# Altium footprint library Connectors THD.PcbLib: 631 footprints (part 33 of 46)
Each footprint in its own frame and in the unit in brackets; x right, y up, seen from the top. Pads: shape width x height; smd on the part's side, far side on the other; paste and mask are expansions set on the pad; w line width, h text height; cw(c..) or ccw(c..) is an arc to the next point about the centre after c.
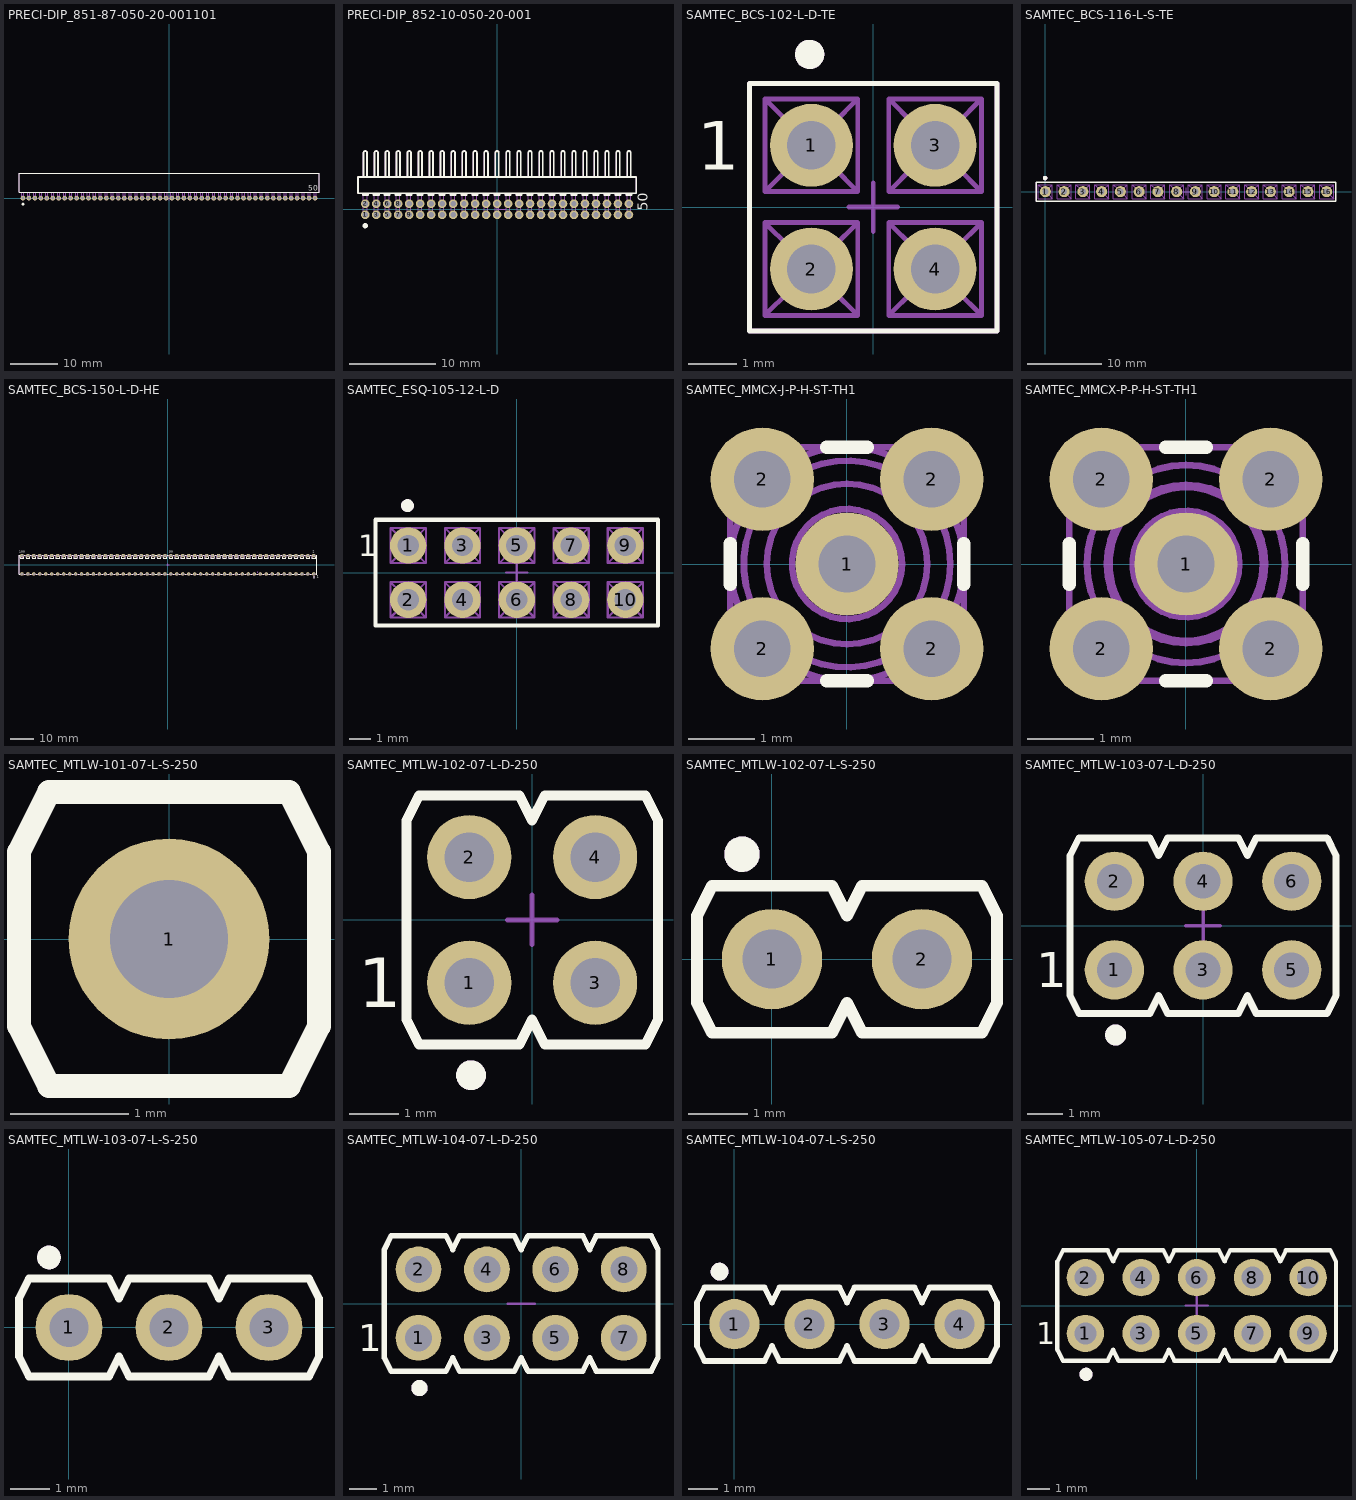
[diagram p32: the footprints below, top view; thin cyan lines are the x and y axes]

## PRECI-DIP_851-87-050-20-001101 [mm] "Pitch 1.27mm, Single Row, Right Angle, 50 Contacts PCB Socket"
height 2.2
pads (50):
  round 1 hole 0.6: 1(-31.115,0) 2(-29.845,0) 3(-28.575,0) 4(-27.305,0) 5(-26.035,0) 6(-24.765,0) 7(-23.495,0) 8(-22.225,0) 9(-20.955,0) 10(-19.685,0) 11(-18.415,0) 12(-17.145,0) 13(-15.875,0) 14(-14.605,0) 15(-13.335,0) 16(-12.065,0) 17(-10.795,0) 18(-9.525,0) 19(-8.255,0) 20(-6.985,0) 21(-5.715,0) 22(-4.445,0) 23(-3.175,0) 24(-1.905,0) 25(-0.635,0) 26(0.635,0) 27(1.905,0) 28(3.175,0) 29(4.445,0) 30(5.715,0) 31(6.985,0) 32(8.255,0) 33(9.525,0) 34(10.795,0) 35(12.065,0) 36(13.335,0) 37(14.605,0) 38(15.875,0) 39(17.145,0) 40(18.415,0) 41(19.685,0) 42(20.955,0) 43(22.225,0) 44(23.495,0) 45(24.765,0) 46(26.035,0) 47(27.305,0) 48(28.575,0) 49(29.845,0) 50(31.115,0)
Top Overlay:
  circle w0.3: c-31.115,-1.27 r0.15
  lines w0.2: -31.955,1.2 -31.955,5.3 31.955,5.3 31.955,1.2 -31.955,1.2
  text "50" at 29.7,1.6 h1.2
Mechanical 8:
  drawing of 202 lines, arcs and shapes, not listed
Mechanical 14:
  drawing of 154 lines, arcs and shapes, not listed
  text "50" at 29.7,1.6 h1.2
3D body: height 2.2, standoff -3.6, extent -31.955,-0.22 31.955,5.3

## PRECI-DIP_852-10-050-20-001 [mm] "50 Contacts, Ultraminiature PCB Pin Connector 1.27mm, Double Row, Solder Tail, Right Angle"
height 3.25
pads (50):
  round 1 hole 0.6: 1(-15.24,-0.635) 2(-15.24,0.635) 3(-13.97,-0.635) 4(-13.97,0.635) 5(-12.7,-0.635) 6(-12.7,0.635) 7(-11.43,-0.635) 8(-11.43,0.635) 9(-10.16,-0.635) 10(-10.16,0.635) 11(-8.89,-0.635) 12(-8.89,0.635) 13(-7.62,-0.635) 14(-7.62,0.635) 15(-6.35,-0.635) 16(-6.35,0.635) 17(-5.08,-0.635) 18(-5.08,0.635) 19(-3.81,-0.635) 20(-3.81,0.635) 21(-2.54,-0.635) 22(-2.54,0.635) 23(-1.27,-0.635) 24(-1.27,0.635) 25(0,-0.635) 26(0,0.635) 27(1.27,-0.635) 28(1.27,0.635) 29(2.54,-0.635) 30(2.54,0.635) 31(3.81,-0.635) 32(3.81,0.635) 33(5.08,-0.635) 34(5.08,0.635) 35(6.35,-0.635) 36(6.35,0.635) 37(7.62,-0.635) 38(7.62,0.635) 39(8.89,-0.635) 40(8.89,0.635) 41(10.16,-0.635) 42(10.16,0.635) 43(11.43,-0.635) 44(11.43,0.635) 45(12.7,-0.635) 46(12.7,0.635) 47(13.97,-0.635) 48(13.97,0.635) 49(15.24,-0.635) 50(15.24,0.635)
Top Overlay:
  drawing of 155 lines, arcs and shapes, not listed
  text "50" at 17.4,-0.2 h1.2
Mechanical 8:
  lines w0.1: 0,1 0,0 1,0
Mechanical 14:
  drawing of 229 lines, arcs and shapes, not listed
3D body: height 3.25, standoff -3.2, extent -16.08,-0.84 16.08,6.735

## SAMTEC_BCS-102-L-D-TE [mm] "4 Contacts - Pitch 2.54mm - Dual Row Horizontal Entry Socket"
height 7.37
pads (4):
  round 1.7 hole 1: 1(-1.27,1.27) 2(-1.27,-1.27) 3(1.27,1.27) 4(1.27,-1.27)
Top Overlay:
  circle w0.3: c-1.305,3.135 r0.15
  lines w0.1: -2.54,-2.54 -2.54,2.54 2.54,2.54 2.54,-2.54 -2.54,-2.54
  text "1" at -3.617,0.772 h1
Mechanical 8:
  lines w0.1: -1.77,-1.27 -1.27,-1.27 ; -1.77,1.27 -1.27,1.27 ; -1.27,-1.77 -1.27,-1.27 ; -1.27,-0.77 -1.27,-1.27 ; -1.27,0.77 -1.27,1.27 ; -1.27,1.77 -1.27,1.27 ; -0.77,-1.27 -1.27,-1.27 ; -0.77,1.27 -1.27,1.27 ; -0.5,0 0,0 ; 0,-0.5 0,0 ; 0,0.5 0,0 ; 0.5,0 0,0 ; 0.77,-1.27 1.27,-1.27 ; 0.77,1.27 1.27,1.27 ; 1.27,-1.77 1.27,-1.27 ; 1.27,0.77 1.27,1.27 ; 1.27,1.77 1.27,1.27 ; 1.77,-1.27 1.27,-1.27 ; 1.77,1.27 1.27,1.27
Mechanical 14:
  circle w0.3: c-1.305,3.135 r0.15
  lines w0.1: -1.71,-0.83 -1.714,-1.714 ; -1.71,1.71 -1.714,0.826 ; 0.83,-0.83 0.826,-1.714 ; 0.83,1.71 0.826,0.826 ; -2.222,-2.222 -1.714,-1.714 ; -2.222,-2.222 -2.222,-0.318 ; -2.222,-2.222 -0.318,-2.222 ; -2.222,-0.318 -1.714,-0.826 -0.826,-0.826 ; -2.222,-0.318 -0.318,-0.318 ; -2.222,0.318 -1.714,0.826 ; -2.222,0.318 -2.222,2.222 ; -2.222,0.318 -0.318,0.318 ; -2.222,2.222 -1.714,1.714 -0.826,1.714 ; -2.222,2.222 -0.318,2.222 ; -1.714,-1.714 -0.826,-1.714 ; -1.714,0.826 -0.826,0.826 ; -0.826,-1.714 -0.318,-2.222 ; -0.826,-1.714 -0.826,-0.826 ; -0.826,-0.826 -0.318,-0.318 ; -0.826,0.826 -0.318,0.318 ; -0.826,0.826 -0.826,1.714 ; -0.826,1.714 -0.318,2.222 ; -0.318,-2.222 -0.318,-0.318 ; -0.318,0.318 -0.318,2.222 ; 0.318,-2.222 0.826,-1.714 ; 0.318,-2.222 0.318,-0.318 ; 0.318,-2.222 2.222,-2.222 ; 0.318,-0.318 0.826,-0.826 1.714,-0.826 ; 0.318,-0.318 2.222,-0.318 ; 0.318,0.318 0.826,0.826 ; 0.318,0.318 0.318,2.222 ; 0.318,0.318 2.222,0.318 ; 0.318,2.222 0.826,1.714 1.714,1.714 ; 0.318,2.222 2.222,2.222 ; 0.826,-1.714 1.714,-1.714 ; 0.826,0.826 1.714,0.826 ; 1.714,-1.714 2.222,-2.222 ; 1.714,-1.714 1.714,-0.826 ; 1.714,-0.826 2.222,-0.318 ; 1.714,0.826 2.222,0.318 ; 1.714,0.826 1.714,1.714 ; 1.714,1.714 2.222,2.222 ; 2.222,-2.222 2.222,-0.318 ; 2.222,0.318 2.222,2.222 ; -2.54,-2.54 -2.54,2.54 2.54,2.54 2.54,-2.54 -2.54,-2.54
  text "1" at -3.617,0.772 h1
3D body: height 7.37, standoff -3.1, extent -2.54,-2.54 2.54,2.54

## SAMTEC_BCS-116-L-S-TE [mm] "16 Contacts - Pitch 2.54mm - Single Row Vertical Entry Socket"
height 7.37
pads (16):
  round 1.5 hole 0.8: 1(0,0) 2(2.54,0) 3(5.08,0) 4(7.62,0) 5(10.16,0) 6(12.7,0) 7(15.24,0) 8(17.78,0) 9(20.32,0) 10(22.86,0) 11(25.4,0) 12(27.94,0) 13(30.48,0) 14(33.02,0) 15(35.56,0) 16(38.1,0)
Top Overlay:
  circle w0.3: c-0.037,1.838 r0.15
  lines w0.2: -1.27,-1.27 -1.27,1.27 39.37,1.27 39.37,-1.27 -1.27,-1.27
Mechanical 8:
  lines w0.1: -0.5,0 0,0 ; 0,-0.5 0,0 ; 0,0.5 0,0 ; 0.5,0 0,0 ; 2.04,0 2.54,0 ; 2.54,-0.5 2.54,0 ; 2.54,0.5 2.54,0 ; 3.04,0 2.54,0 ; 4.58,0 5.08,0 ; 5.08,-0.5 5.08,0 ; 5.08,0.5 5.08,0 ; 5.58,0 5.08,0 ; 7.12,0 7.62,0 ; 7.62,-0.5 7.62,0 ; 7.62,0.5 7.62,0 ; 8.12,0 7.62,0 ; 9.66,0 10.16,0 ; 10.16,-0.5 10.16,0 ; 10.16,0.5 10.16,0 ; 10.66,0 10.16,0 ; 12.2,0 12.7,0 ; 12.7,-0.5 12.7,0 ; 12.7,0.5 12.7,0 ; 13.2,0 12.7,0 ; 14.74,0 15.24,0 ; 15.24,-0.5 15.24,0 ; 15.24,0.5 15.24,0 ; 15.74,0 15.24,0 ; 17.28,0 17.78,0 ; 17.78,-0.5 17.78,0 ; 17.78,0.5 17.78,0 ; 18.28,0 17.78,0 ; 18.55,0 19.05,0 ; 19.05,-0.5 19.05,0 ; 19.05,0.5 19.05,0 ; 19.55,0 19.05,0 ; 19.82,0 20.32,0 ; 20.32,-0.5 20.32,0 ; 20.32,0.5 20.32,0 ; 20.82,0 20.32,0 ; 22.36,0 22.86,0 ; 22.86,-0.5 22.86,0 ; 22.86,0.5 22.86,0 ; 23.36,0 22.86,0 ; 24.9,0 25.4,0 ; 25.4,-0.5 25.4,0 ; 25.4,0.5 25.4,0 ; 25.9,0 25.4,0 ; 27.44,0 27.94,0 ; 27.94,-0.5 27.94,0 ; 27.94,0.5 27.94,0 ; 28.44,0 27.94,0 ; 29.98,0 30.48,0 ; 30.48,-0.5 30.48,0 ; 30.48,0.5 30.48,0 ; 30.98,0 30.48,0 ; 32.52,0 33.02,0 ; 33.02,-0.5 33.02,0 ; 33.02,0.5 33.02,0 ; 33.52,0 33.02,0 ; 35.06,0 35.56,0 ; 35.56,-0.5 35.56,0 ; 35.56,0.5 35.56,0 ; 36.06,0 35.56,0 ; 37.6,0 38.1,0 ; 38.1,-0.5 38.1,0 ; 38.1,0.5 38.1,0 ; 38.6,0 38.1,0
Mechanical 14:
  drawing of 181 lines, arcs and shapes, not listed
3D body: height 7.37, standoff -3.1, extent -1.27,-1.27 39.37,1.27

## SAMTEC_BCS-150-L-D-HE [mm] "100 Contacts - Pitch 2.54mm - Dual Row Horizontal Entry Socket"
height 5.72
pads (100):
  round 1.5 hole 0.8: 1(62.23,-3.935) 2(62.23,3.935) 3(59.69,-3.935) 4(59.69,3.935) 5(57.15,-3.935) 6(57.15,3.935) 7(54.61,-3.935) 8(54.61,3.935) 9(52.07,-3.935) 10(52.07,3.935) 11(49.53,-3.935) 12(49.53,3.935) 13(46.99,-3.935) 14(46.99,3.935) 15(44.45,-3.935) 16(44.45,3.935) 17(41.91,-3.935) 18(41.91,3.935) 19(39.37,-3.935) 20(39.37,3.935) 21(36.83,-3.935) 22(36.83,3.935) 23(34.29,-3.935) 24(34.29,3.935) 25(31.75,-3.935) 26(31.75,3.935) 27(29.21,-3.935) 28(29.21,3.935) 29(26.67,-3.935) 30(26.67,3.935) 31(24.13,-3.935) 32(24.13,3.935) 33(21.59,-3.935) 34(21.59,3.935) 35(19.05,-3.935) 36(19.05,3.935) 37(16.51,-3.935) 38(16.51,3.935) 39(13.97,-3.935) 40(13.97,3.935) 41(11.43,-3.935) 42(11.43,3.935) 43(8.89,-3.935) 44(8.89,3.935) 45(6.35,-3.935) 46(6.35,3.935) 47(3.81,-3.935) 48(3.81,3.935) 49(1.27,-3.935) 50(1.27,3.935) 51(-1.27,-3.935) 52(-1.27,3.935) 53(-3.81,-3.935) 54(-3.81,3.935) 55(-6.35,-3.935) 56(-6.35,3.935) 57(-8.89,-3.935) 58(-8.89,3.935) 59(-11.43,-3.935) 60(-11.43,3.935) 61(-13.97,-3.935) 62(-13.97,3.935) 63(-16.51,-3.935) 64(-16.51,3.935) 65(-19.05,-3.935) 66(-19.05,3.935) 67(-21.59,-3.935) 68(-21.59,3.935) 69(-24.13,-3.935) 70(-24.13,3.935) 71(-26.67,-3.935) 72(-26.67,3.935) 73(-29.21,-3.935) 74(-29.21,3.935) 75(-31.75,-3.935) 76(-31.75,3.935) 77(-34.29,-3.935) 78(-34.29,3.935) 79(-36.83,-3.935) 80(-36.83,3.935) 81(-39.37,-3.935) 82(-39.37,3.935) 83(-41.91,-3.935) 84(-41.91,3.935) 85(-44.45,-3.935) 86(-44.45,3.935) 87(-46.99,-3.935) 88(-46.99,3.935) 89(-49.53,-3.935) 90(-49.53,3.935) 91(-52.07,-3.935) 92(-52.07,3.935) 93(-54.61,-3.935) 94(-54.61,3.935) 95(-57.15,-3.935) 96(-57.15,3.935) 97(-59.69,-3.935) 98(-59.69,3.935) 99(-62.23,-3.935) 100(-62.23,3.935)
Top Overlay:
  drawing of 257 lines, arcs and shapes, not listed
  text "2" at 61.86,5.175 h1
  text "1" at 63.405,-5.546 h1.02
  text "100" at -63.375,5.136 h1
  text "50" at 0.5,5.175 h1
Mechanical 8:
  drawing of 405 lines, arcs and shapes, not listed
Mechanical 14:
  drawing of 308 lines, arcs and shapes, not listed
  text "2" at 61.86,5.175 h1
  text "1" at 63.405,-5.546 h1.02
  text "100" at -63.375,5.136 h1
  text "50" at 0.5,5.175 h1
3D body: height 5.72, standoff -3.1, extent -63.5,-4.064 63.5,4.064

## SAMTEC_ESQ-105-12-L-D [mm] "10 Contacts, Pitch 2.54mm - Top Entry, Dual Row, Through Mount Straigh Socket"
height 11.05
pads (10):
  round 1.7 hole 1: 1(-5.08,1.27) 2(-5.08,-1.27) 3(-2.54,1.27) 4(-2.54,-1.27) 5(0,1.27) 6(0,-1.27) 7(2.54,1.27) 8(2.54,-1.27) 9(5.08,1.27) 10(5.08,-1.27)
Top Overlay:
  circle w0.3: c-5.115,3.135 r0.15
  lines w0.2: -6.604,-2.477 -6.604,2.477 6.604,2.477 6.604,-2.477 -6.604,-2.477
  text "1" at -7.427,0.772 h1
Mechanical 8:
  lines w0.1: -5.58,-1.27 -5.08,-1.27 ; -5.58,1.27 -5.08,1.27 ; -5.08,-1.77 -5.08,-1.27 ; -5.08,-0.77 -5.08,-1.27 ; -5.08,0.77 -5.08,1.27 ; -5.08,1.77 -5.08,1.27 ; -4.58,-1.27 -5.08,-1.27 ; -4.58,1.27 -5.08,1.27 ; -3.04,-1.27 -2.54,-1.27 ; -3.04,1.27 -2.54,1.27 ; -2.54,-1.77 -2.54,-1.27 ; -2.54,-0.77 -2.54,-1.27 ; -2.54,0.77 -2.54,1.27 ; -2.54,1.77 -2.54,1.27 ; -2.04,-1.27 -2.54,-1.27 ; -2.04,1.27 -2.54,1.27 ; -0.5,-1.27 0,-1.27 ; -0.5,0 0,0 ; -0.5,1.27 0,1.27 ; 0,-1.77 0,-1.27 ; 0,-0.77 0,-1.27 ; 0,-0.5 0,0 ; 0,0.5 0,0 ; 0,0.77 0,1.27 ; 0,1.77 0,1.27 ; 0.5,-1.27 0,-1.27 ; 0.5,0 0,0 ; 0.5,1.27 0,1.27 ; 2.04,-1.27 2.54,-1.27 ; 2.04,1.27 2.54,1.27 ; 2.54,-1.77 2.54,-1.27 ; 2.54,-0.77 2.54,-1.27 ; 2.54,0.77 2.54,1.27 ; 2.54,1.77 2.54,1.27 ; 3.04,-1.27 2.54,-1.27 ; 3.04,1.27 2.54,1.27 ; 4.58,-1.27 5.08,-1.27 ; 4.58,1.27 5.08,1.27 ; 5.08,-1.77 5.08,-1.27 ; 5.08,-0.77 5.08,-1.27 ; 5.08,0.77 5.08,1.27 ; 5.08,1.77 5.08,1.27 ; 5.58,-1.27 5.08,-1.27 ; 5.58,1.27 5.08,1.27
Mechanical 14:
  circle w0.3: c-5.115,3.135 r0.15
  lines w0.1: -5.906,-2.095 -5.474,-1.664 ; -5.906,-2.095 -5.906,-0.445 ; -5.906,-2.095 -4.255,-2.095 ; -5.906,-0.445 -5.474,-0.876 ; -5.906,-0.445 -4.255,-0.445 ; -5.906,0.445 -5.474,0.876 ; -5.906,0.445 -5.906,2.095 ; -5.906,0.445 -4.255,0.445 ; -5.906,2.095 -5.474,1.664 ; -5.906,2.095 -4.255,2.095 ; -5.474,-1.664 -5.474,-0.876 ; -5.474,-1.664 -4.686,-1.664 ; -5.474,-0.876 -4.686,-0.876 ; -5.474,0.876 -5.474,1.664 ; -5.474,0.876 -4.686,0.876 ; -5.474,1.664 -4.686,1.664 ; -4.686,-1.664 -4.255,-2.095 ; -4.686,-1.664 -4.686,-0.876 ; -4.686,-0.876 -4.255,-0.445 ; -4.686,0.876 -4.255,0.445 ; -4.686,0.876 -4.686,1.664 ; -4.686,1.664 -4.255,2.095 ; -4.255,-2.095 -4.255,-0.445 ; -4.255,0.445 -4.255,2.095 ; -3.366,-2.095 -2.934,-1.664 ; -3.366,-2.095 -3.366,-0.445 ; -3.366,-2.095 -1.714,-2.095 ; -3.366,-0.445 -2.934,-0.876 ; -3.366,-0.445 -1.714,-0.445 ; -3.366,0.445 -2.934,0.876 ; -3.366,0.445 -3.366,2.095 ; -3.366,0.445 -1.714,0.445 ; -3.366,2.095 -2.934,1.664 ; -3.366,2.095 -1.714,2.095 ; -2.934,-1.664 -2.934,-0.876 ; -2.934,-1.664 -2.146,-1.664 ; -2.934,-0.876 -2.146,-0.876 ; -2.934,0.876 -2.934,1.664 ; -2.934,0.876 -2.146,0.876 ; -2.934,1.664 -2.146,1.664 ; -2.146,-1.664 -1.714,-2.095 ; -2.146,-1.664 -2.146,-0.876 ; -2.146,-0.876 -1.714,-0.445 ; -2.146,0.876 -1.714,0.445 ; -2.146,0.876 -2.146,1.664 ; -2.146,1.664 -1.714,2.095 ; -1.714,-2.095 -1.714,-0.445 ; -1.714,0.445 -1.714,2.095 ; -0.826,-2.095 -0.394,-1.664 ; -0.826,-2.095 -0.826,-0.445 ; -0.826,-2.095 0.826,-2.095 ; -0.826,-0.445 -0.394,-0.876 ; -0.826,-0.445 0.826,-0.445 ; -0.826,0.445 -0.394,0.876 ; -0.826,0.445 -0.826,2.095 ; -0.826,0.445 0.826,0.445 ; -0.826,2.095 -0.394,1.664 ; -0.826,2.095 0.826,2.095 ; -0.394,-1.664 -0.394,-0.876 ; -0.394,-1.664 0.394,-1.664 ; -0.394,-0.876 0.394,-0.876 ; -0.394,0.876 -0.394,1.664 ; -0.394,0.876 0.394,0.876 ; -0.394,1.664 0.394,1.664 ; 0.394,-1.664 0.826,-2.095 ; 0.394,-1.664 0.394,-0.876 ; 0.394,-0.876 0.826,-0.445 ; 0.394,0.876 0.826,0.445 ; 0.394,0.876 0.394,1.664 ; 0.394,1.664 0.826,2.095 ; 0.826,-2.095 0.826,-0.445 ; 0.826,0.445 0.826,2.095 ; 1.714,-2.095 2.146,-1.664 ; 1.714,-2.095 1.714,-0.445 ; 1.714,-2.095 3.366,-2.095 ; 1.714,-0.445 2.146,-0.876 ; 1.714,-0.445 3.366,-0.445 ; 1.714,0.445 2.146,0.876 ; 1.714,0.445 1.714,2.095 ; 1.714,0.445 3.366,0.445 ; 1.714,2.095 2.146,1.664 ; 1.714,2.095 3.366,2.095 ; 2.146,-1.664 2.146,-0.876 ; 2.146,-1.664 2.934,-1.664 ; 2.146,-0.876 2.934,-0.876 ; 2.146,0.876 2.146,1.664 ; 2.146,0.876 2.934,0.876 ; 2.146,1.664 2.934,1.664 ; 2.934,-1.664 3.366,-2.095 ; 2.934,-1.664 2.934,-0.876 ; 2.934,-0.876 3.366,-0.445 ; 2.934,0.876 3.366,0.445 ; 2.934,0.876 2.934,1.664 ; 2.934,1.664 3.366,2.095 ; 3.366,-2.095 3.366,-0.445 ; 3.366,0.445 3.366,2.095 ; 4.255,-2.095 4.686,-1.664 ; 4.255,-2.095 4.255,-0.445 ; 4.255,-2.095 5.906,-2.095 ; 4.255,-0.445 4.686,-0.876 ; 4.255,-0.445 5.906,-0.445 ; 4.255,0.445 4.686,0.876 ; 4.255,0.445 4.255,2.095 ; 4.255,0.445 5.906,0.445 ; 4.255,2.095 4.686,1.664 ; 4.255,2.095 5.906,2.095 ; 4.686,-1.664 4.686,-0.876 ; 4.686,-1.664 5.474,-1.664 ; 4.686,-0.876 5.474,-0.876 ; 4.686,0.876 4.686,1.664 ; 4.686,0.876 5.474,0.876 ; 4.686,1.664 5.474,1.664 ; 5.474,-1.664 5.906,-2.095 ; 5.474,-1.664 5.474,-0.876 ; 5.474,-0.876 5.906,-0.445 ; 5.474,0.876 5.906,0.445 ; 5.474,0.876 5.474,1.664 ; 5.474,1.664 5.906,2.095 ; 5.906,-2.095 5.906,-0.445 ; 5.906,0.445 5.906,2.095 ; -6.604,-2.477 -6.604,2.477 6.604,2.477 6.604,-2.477 -6.604,-2.477
  text "1" at -7.427,0.772 h1
3D body: height 11.05, standoff -2.29, extent -6.604,-2.54 6.604,2.54

## SAMTEC_MMCX-J-P-H-ST-TH1 [mm] "Straight Through-hole 50 Ohm Micro Mini RF Jack, MMCX Serie"
height 4.35
pads (5):
  round 1.55 hole 0.85: 1(0,0) 2(-1.27,-1.27) 2(-1.27,1.27) 2(1.27,-1.27) 2(1.27,1.27)
Top Overlay:
  lines w0.2: -1.75,-0.308 -1.75,0.308 ; -0.308,-1.75 0.308,-1.75 ; -0.308,1.75 0.308,1.75 ; 1.75,-0.308 1.75,0.308
Mechanical 8:
  lines w0.1: -1.77,-1.27 -1.27,-1.27 ; -1.77,1.27 -1.27,1.27 ; -1.27,-1.77 -1.27,-1.27 ; -1.27,-0.77 -1.27,-1.27 ; -1.27,0.77 -1.27,1.27 ; -1.27,1.77 -1.27,1.27 ; -0.77,-1.27 -1.27,-1.27 ; -0.77,1.27 -1.27,1.27 ; -0.5,0 0,0 ; 0,-0.5 0,0 ; 0,0.5 0,0 ; 0.5,0 0,0 ; 0.77,-1.27 1.27,-1.27 ; 0.77,1.27 1.27,1.27 ; 1.27,-1.77 1.27,-1.27 ; 1.27,-0.77 1.27,-1.27 ; 1.27,0.77 1.27,1.27 ; 1.27,1.77 1.27,1.27 ; 1.77,-1.27 1.27,-1.27 ; 1.77,1.27 1.27,1.27
Mechanical 14:
  circle w0.1: c0,0 r1.205
  circle w0.1: c0,0 r0.825
  circle w0.1: c0.002,0 r0.251
  circle w0.1: c0,0 r1.75
  circle w0.1: c0,0 r1.549
  lines w0.1: -1.75,-1.414 ccw(c0,0) -1.414,-1.75 1.414,-1.75 ccw(c0,0) 1.75,-1.414 1.75,1.414 ccw(c0,0) 1.414,1.75 -1.414,1.75 ccw(c0,0) -1.75,1.414 -1.75,-1.414
3D body: height 4.35, standoff -3.05, extent -1.75,-1.75 1.75,1.75

## SAMTEC_MMCX-P-P-H-ST-TH1 [mm] "Straight Through-hole 50 Ohm Micro Mini RF Plug, MMCX Serie"
height 4.35
pads (5):
  round 1.55 hole 0.85: 1(0,0) 2(-1.27,-1.27) 2(-1.27,1.27) 2(1.27,-1.27) 2(1.27,1.27)
Top Overlay:
  lines w0.2: -1.75,-0.308 -1.75,0.308 ; -0.308,-1.75 0.308,-1.75 ; -0.308,1.75 0.308,1.75 ; 1.75,-0.308 1.75,0.308
Mechanical 8:
  circle w0.1: c0,0 r1.15
  lines w0.1: -1.77,-1.27 -1.27,-1.27 ; -1.77,1.27 -1.27,1.27 ; -1.27,-1.77 -1.27,-1.27 ; -1.27,-0.77 -1.27,-1.27 ; -1.27,0.77 -1.27,1.27 ; -1.27,1.77 -1.27,1.27 ; -0.77,-1.27 -1.27,-1.27 ; -0.77,1.27 -1.27,1.27 ; -0.5,0 0,0 ; 0,-0.5 0,0 ; 0,0.5 0,0 ; 0.5,0 0,0 ; 0.77,-1.27 1.27,-1.27 ; 0.77,1.27 1.27,1.27 ; 1.27,-1.77 1.27,-1.27 ; 1.27,-0.77 1.27,-1.27 ; 1.27,0.77 1.27,1.27 ; 1.27,1.77 1.27,1.27 ; 1.77,-1.27 1.27,-1.27 ; 1.77,1.27 1.27,1.27
Mechanical 14:
  circle w0.1: c0,0 r0.138
  circle w0.1: c0,0 r0.05
  circle w0.1: c0,0 r1.485
  circle w0.1: c0,0 r1.19
  circle w0.1: c0,0 r0.8
  lines w0.1: -1.75,-1.414 ccw(c0,0) -1.414,-1.75 1.414,-1.75 ccw(c0,0) 1.75,-1.414 1.75,1.414 ccw(c0,0) 1.414,1.75 -1.414,1.75 ccw(c0,0) -1.75,1.414 -1.75,-1.414
3D body: height 4.35, standoff -3.05, extent -1.75,-1.75 1.75,1.75

## SAMTEC_MTLW-101-07-L-S-250 [mm] "1 Contacts - Pitch 2.54mm - Single Row Through Mount Straight Header (Post Lead = 6.35mm, Tail Lead 3.05mm, Insulator 1.52mm)"
height 7.87
pads (1):
  round 1.7 hole 1: 1(0,0)
Top Overlay:
  lines w0.2: -1.27,-0.737 -1.27,0.737 -1.016,1.245 1.016,1.245 1.27,0.737 1.27,-0.737 1.016,-1.245 -1.016,-1.245 -1.27,-0.737
Mechanical 8:
  lines w0.1: -0.5,0 0,0 ; 0,-0.5 0,0 ; 0,0.5 0,0 ; 0.5,0 0,0
Mechanical 14:
  lines w0.1: -1.27,-0.737 -1.27,0.737 -1.016,1.245 1.016,1.245 1.27,0.737 1.27,-0.737 1.016,-1.245 -1.016,-1.245 -1.27,-0.737 ; -0.318,-0.318 -0.318,0.318 0.318,0.318 0.318,-0.318 -0.318,-0.318
3D body: height 7.87, standoff -3.05, extent -1.27,-1.244 1.27,1.245

## SAMTEC_MTLW-102-07-L-D-250 [mm] "4 Contacts - Pitch 2.54mm - Dual Row Through Mount Straight Header (Post Lead = 6.35mm, Tail Lead 3.05mm, Insulator 1.52mm)"
height 7.87
pads (4):
  round 1.7 hole 1: 1(-1.27,-1.27) 2(-1.27,1.27) 3(1.27,-1.27) 4(1.27,1.27)
Top Overlay:
  circle w0.3: c-1.235,-3.135 r0.15
  lines w0.2: 2.54,-2.007 2.286,-2.515 0.254,-2.515 0,-2.007 -0.254,-2.515 -2.286,-2.515 -2.54,-2.007 -2.54,2.007 -2.286,2.515 -0.254,2.515 0,2.007 0.254,2.515 2.286,2.515 2.54,2.007 ; 2.54,-2.007 2.54,2.007 ; 2.54,-2.007 2.54,2.007
  text "1" at -3.517,-1.768 h1
Mechanical 8:
  lines w0.1: -1.77,-1.27 -1.27,-1.27 ; -1.77,1.27 -1.27,1.27 ; -1.27,-1.77 -1.27,-1.27 ; -1.27,-0.77 -1.27,-1.27 ; -1.27,0.77 -1.27,1.27 ; -1.27,1.77 -1.27,1.27 ; -0.77,-1.27 -1.27,-1.27 ; -0.77,1.27 -1.27,1.27 ; -0.5,0 0,0 ; 0,-0.5 0,0 ; 0,0.5 0,0 ; 0.5,0 0,0 ; 0.77,-1.27 1.27,-1.27 ; 0.77,1.27 1.27,1.27 ; 1.27,-1.77 1.27,-1.27 ; 1.27,-0.77 1.27,-1.27 ; 1.27,0.77 1.27,1.27 ; 1.27,1.77 1.27,1.27 ; 1.77,-1.27 1.27,-1.27 ; 1.77,1.27 1.27,1.27
Mechanical 14:
  circle w0.3: c-1.235,-3.135 r0.15
  lines w0.1: 2.54,-2.007 2.286,-2.515 0.254,-2.515 0,-2.007 -0.254,-2.515 -2.286,-2.515 -2.54,-2.007 -2.54,2.007 -2.286,2.515 -0.254,2.515 0,2.007 0.254,2.515 2.286,2.515 2.54,2.007 ; 2.54,-2.007 2.54,2.007 ; 2.54,-2.007 2.54,2.007 ; -1.587,-1.587 -1.587,-0.953 -0.953,-0.953 -0.953,-1.587 -1.587,-1.587 ; -1.587,0.953 -1.587,1.587 -0.953,1.587 -0.953,0.953 -1.587,0.953 ; 0.953,-1.587 0.953,-0.953 1.587,-0.953 1.587,-1.587 0.953,-1.587 ; 0.953,0.953 0.953,1.587 1.587,1.587 1.587,0.953 0.953,0.953
  text "1" at -3.517,-1.768 h1
3D body: height 7.87, standoff -3.05, extent -2.54,-2.514 2.54,2.515

## SAMTEC_MTLW-102-07-L-S-250 [mm] "2 Contacts - Pitch 2.54mm - Single Row Through Mount Straight Header (Post Lead = 6.35mm, Tail Lead 3.05mm, Insulator 1.52mm)"
height 7.87
pads (2):
  round 1.7 hole 1: 1(0,0) 2(2.54,0)
Top Overlay:
  circle w0.3: c-0.508,1.778 r0.15
  lines w0.2: -1.27,-0.737 -1.016,-1.245 1.016,-1.245 1.27,-0.737 1.524,-1.245 3.556,-1.245 3.81,-0.737 3.81,0.737 3.556,1.245 1.524,1.245 1.27,0.737 1.016,1.245 -1.016,1.245 -1.27,0.737 -1.27,-0.737
Mechanical 8:
  lines w0.1: -0.5,0 0,0 ; 0,-0.5 0,0 ; 0,0.5 0,0 ; 0.5,0 0,0 ; 2.04,0 2.54,0 ; 2.54,-0.5 2.54,0 ; 2.54,0.5 2.54,0 ; 3.04,0 2.54,0
Mechanical 14:
  circle w0.3: c-0.508,1.778 r0.15
  lines w0.1: -1.27,-0.737 -1.016,-1.245 1.016,-1.245 1.27,-0.737 1.524,-1.245 3.556,-1.245 3.81,-0.737 3.81,0.737 3.556,1.245 1.524,1.245 1.27,0.737 1.016,1.245 -1.016,1.245 -1.27,0.737 -1.27,-0.737 ; -0.317,-0.318 0.318,-0.318 0.318,0.318 -0.317,0.318 -0.317,-0.318 ; 2.223,-0.318 2.858,-0.318 2.858,0.318 2.223,0.318 2.223,-0.318
3D body: height 7.87, standoff -3.05, extent -1.27,-1.244 3.81,1.245

## SAMTEC_MTLW-103-07-L-D-250 [mm] "6 Contacts - Pitch 2.54mm - Dual Row Through Mount Straight Header (Post Lead = 6.35mm, Tail Lead 3.05mm, Insulator 1.52mm)"
height 7.87
pads (6):
  round 1.7 hole 1: 1(-2.54,-1.27) 2(-2.54,1.27) 3(0,-1.27) 4(0,1.27) 5(2.54,-1.27) 6(2.54,1.27)
Top Overlay:
  circle w0.3: c-2.505,-3.135 r0.15
  lines w0.2: 3.81,-2.007 3.81,2.007 ; 3.81,-2.007 3.556,-2.515 1.524,-2.515 1.27,-2.007 1.016,-2.515 -1.016,-2.515 -1.27,-2.007 -1.524,-2.515 -3.556,-2.515 -3.81,-2.007 -3.81,2.007 -3.556,2.515 -1.524,2.515 -1.27,2.007 -1.016,2.515 1.016,2.515 1.27,2.007 1.524,2.515 3.556,2.515 3.81,2.007 ; 3.81,-2.007 3.81,2.007
  text "1" at -4.787,-1.768 h1
Mechanical 8:
  lines w0.1: -3.04,-1.27 -2.54,-1.27 ; -3.04,1.27 -2.54,1.27 ; -2.54,-1.77 -2.54,-1.27 ; -2.54,-0.77 -2.54,-1.27 ; -2.54,0.77 -2.54,1.27 ; -2.54,1.77 -2.54,1.27 ; -2.04,-1.27 -2.54,-1.27 ; -2.04,1.27 -2.54,1.27 ; -0.5,-1.27 0,-1.27 ; -0.5,0 0,0 ; -0.5,1.27 0,1.27 ; 0,-1.77 0,-1.27 ; 0,-0.77 0,-1.27 ; 0,-0.5 0,0 ; 0,0.5 0,0 ; 0,0.77 0,1.27 ; 0,1.77 0,1.27 ; 0.5,-1.27 0,-1.27 ; 0.5,0 0,0 ; 0.5,1.27 0,1.27 ; 2.04,-1.27 2.54,-1.27 ; 2.04,1.27 2.54,1.27 ; 2.54,-1.77 2.54,-1.27 ; 2.54,-0.77 2.54,-1.27 ; 2.54,0.77 2.54,1.27 ; 2.54,1.77 2.54,1.27 ; 3.04,-1.27 2.54,-1.27 ; 3.04,1.27 2.54,1.27
Mechanical 14:
  circle w0.3: c-2.505,-3.135 r0.15
  lines w0.1: 3.81,-2.007 3.81,2.007 ; 3.81,-2.007 3.556,-2.515 1.524,-2.515 1.27,-2.007 1.016,-2.515 -1.016,-2.515 -1.27,-2.007 -1.524,-2.515 -3.556,-2.515 -3.81,-2.007 -3.81,2.007 -3.556,2.515 -1.524,2.515 -1.27,2.007 -1.016,2.515 1.016,2.515 1.27,2.007 1.524,2.515 3.556,2.515 3.81,2.007 ; 3.81,-2.007 3.81,2.007 ; -2.858,-1.587 -2.858,-0.953 -2.222,-0.953 -2.222,-1.587 -2.858,-1.587 ; -2.858,0.953 -2.858,1.587 -2.222,1.587 -2.222,0.953 -2.858,0.953 ; -0.318,-1.587 -0.318,-0.953 0.318,-0.953 0.318,-1.587 -0.318,-1.587 ; -0.318,0.953 -0.318,1.587 0.318,1.587 0.318,0.953 -0.318,0.953 ; 2.222,-1.587 2.222,-0.953 2.858,-0.953 2.858,-1.587 2.222,-1.587 ; 2.222,0.953 2.222,1.587 2.858,1.587 2.858,0.953 2.222,0.953
  text "1" at -4.787,-1.768 h1
3D body: height 7.87, standoff -3.05, extent -3.81,-2.514 3.81,2.515

## SAMTEC_MTLW-103-07-L-S-250 [mm] "3 Contacts - Pitch 2.54mm - Single Row Through Mount Straight Header (Post Lead = 6.35mm, Tail Lead 3.05mm, Insulator 1.52mm)"
height 7.87
pads (3):
  round 1.7 hole 1: 1(0,0) 2(2.54,0) 3(5.08,0)
Top Overlay:
  circle w0.3: c-0.508,1.778 r0.15
  lines w0.2: -1.27,-0.737 -1.016,-1.245 1.016,-1.245 1.27,-0.737 1.524,-1.245 3.556,-1.245 3.81,-0.737 4.064,-1.245 6.096,-1.245 6.35,-0.737 6.35,0.737 6.096,1.245 4.064,1.245 3.81,0.737 3.556,1.245 1.524,1.245 1.27,0.737 1.016,1.245 -1.016,1.245 -1.27,0.737 -1.27,-0.737
Mechanical 8:
  lines w0.1: -0.5,0 0,0 ; 0,-0.5 0,0 ; 0,0.5 0,0 ; 0.5,0 0,0 ; 2.04,0 2.54,0 ; 2.54,-0.5 2.54,0 ; 2.54,0.5 2.54,0 ; 3.04,0 2.54,0 ; 4.58,0 5.08,0 ; 5.08,-0.5 5.08,0 ; 5.08,0.5 5.08,0 ; 5.58,0 5.08,0
Mechanical 14:
  circle w0.3: c-0.508,1.778 r0.15
  lines w0.1: -1.27,-0.737 -1.016,-1.245 1.016,-1.245 1.27,-0.737 1.524,-1.245 3.556,-1.245 3.81,-0.737 4.064,-1.245 6.096,-1.245 6.35,-0.737 6.35,0.737 6.096,1.245 4.064,1.245 3.81,0.737 3.556,1.245 1.524,1.245 1.27,0.737 1.016,1.245 -1.016,1.245 -1.27,0.737 -1.27,-0.737 ; -0.317,-0.318 0.318,-0.318 0.318,0.318 -0.317,0.318 -0.317,-0.318 ; 2.223,-0.318 2.858,-0.318 2.858,0.318 2.223,0.318 2.223,-0.318 ; 4.763,-0.318 5.398,-0.318 5.398,0.318 4.763,0.318 4.763,-0.318
3D body: height 7.87, standoff -3.05, extent -1.27,-1.244 6.35,1.245

## SAMTEC_MTLW-104-07-L-D-250 [mm] "8 Contacts - Pitch 2.54mm - Dual Row Through Mount Straight Header (Post Lead = 6.35mm, Tail Lead 3.05mm, Insulator 1.52mm)"
height 7.87
pads (8):
  round 1.7 hole 1: 1(-3.81,-1.27) 2(-3.81,1.27) 3(-1.27,-1.27) 4(-1.27,1.27) 5(1.27,-1.27) 6(1.27,1.27) 7(3.81,-1.27) 8(3.81,1.27)
Top Overlay:
  circle w0.3: c-3.775,-3.135 r0.15
  lines w0.2: 5.08,-2.007 5.08,2.007 ; 5.08,-2.007 4.826,-2.515 2.794,-2.515 2.54,-2.007 2.286,-2.515 0.254,-2.515 0,-2.007 -0.254,-2.515 -2.286,-2.515 -2.54,-2.007 -2.794,-2.515 -4.826,-2.515 -5.08,-2.007 -5.08,2.007 -4.826,2.515 -2.794,2.515 -2.54,2.007 -2.286,2.515 -0.254,2.515 0,2.007 0.254,2.515 2.286,2.515 2.54,2.007 2.794,2.515 4.826,2.515 5.08,2.007 ; 5.08,-2.007 5.08,2.007
  text "1" at -6.057,-1.768 h1
Mechanical 8:
  lines w0.1: -4.31,-1.27 -3.81,-1.27 ; -4.31,1.27 -3.81,1.27 ; -3.81,-1.77 -3.81,-1.27 ; -3.81,-0.77 -3.81,-1.27 ; -3.81,0.77 -3.81,1.27 ; -3.81,1.77 -3.81,1.27 ; -3.31,-1.27 -3.81,-1.27 ; -3.31,1.27 -3.81,1.27 ; -1.77,-1.27 -1.27,-1.27 ; -1.77,1.27 -1.27,1.27 ; -1.27,-1.77 -1.27,-1.27 ; -1.27,-0.77 -1.27,-1.27 ; -1.27,0.77 -1.27,1.27 ; -1.27,1.77 -1.27,1.27 ; -0.77,-1.27 -1.27,-1.27 ; -0.77,1.27 -1.27,1.27 ; -0.5,0 0,0 0.5,0 ; 0.77,-1.27 1.27,-1.27 ; 0.77,1.27 1.27,1.27 ; 1.27,-1.77 1.27,-1.27 ; 1.27,-0.77 1.27,-1.27 ; 1.27,0.77 1.27,1.27 ; 1.27,1.77 1.27,1.27 ; 1.77,-1.27 1.27,-1.27 ; 1.77,1.27 1.27,1.27 ; 3.31,-1.27 3.81,-1.27 ; 3.31,1.27 3.81,1.27 ; 3.81,-1.77 3.81,-1.27 ; 3.81,-0.77 3.81,-1.27 ; 3.81,0.77 3.81,1.27 ; 3.81,1.77 3.81,1.27 ; 4.31,-1.27 3.81,-1.27 ; 4.31,1.27 3.81,1.27
Mechanical 14:
  circle w0.3: c-3.775,-3.135 r0.15
  lines w0.1: 5.08,-2.007 5.08,2.007 ; 5.08,-2.007 4.826,-2.515 2.794,-2.515 2.54,-2.007 2.286,-2.515 0.254,-2.515 0,-2.007 -0.254,-2.515 -2.286,-2.515 -2.54,-2.007 -2.794,-2.515 -4.826,-2.515 -5.08,-2.007 -5.08,2.007 -4.826,2.515 -2.794,2.515 -2.54,2.007 -2.286,2.515 -0.254,2.515 0,2.007 0.254,2.515 2.286,2.515 2.54,2.007 2.794,2.515 4.826,2.515 5.08,2.007 ; 5.08,-2.007 5.08,2.007 ; -4.128,-1.587 -3.493,-1.587 -3.493,-0.953 -4.128,-0.953 -4.128,-1.587 ; -4.128,0.953 -3.493,0.953 -3.493,1.587 -4.128,1.587 -4.128,0.953 ; -1.587,-1.587 -0.953,-1.587 -0.953,-0.953 -1.587,-0.953 -1.587,-1.587 ; -1.587,0.953 -0.953,0.953 -0.953,1.587 -1.587,1.587 -1.587,0.953 ; 0.953,-1.587 1.587,-1.587 1.587,-0.953 0.953,-0.953 0.953,-1.587 ; 0.953,0.953 1.587,0.953 1.587,1.587 0.953,1.587 0.953,0.953 ; 3.493,-1.587 4.128,-1.587 4.128,-0.953 3.493,-0.953 3.493,-1.587 ; 3.493,0.953 4.128,0.953 4.128,1.587 3.493,1.587 3.493,0.953
  text "1" at -6.057,-1.768 h1
3D body: height 7.87, standoff -3.05, extent -5.08,-2.514 5.08,2.515

## SAMTEC_MTLW-104-07-L-S-250 [mm] "4 Contacts - Pitch 2.54mm - Single Row Through Mount Straight Header (Post Lead = 6.35mm, Tail Lead 3.05mm, Insulator 1.52mm)"
height 7.87
pads (4):
  round 1.7 hole 1: 1(0,0) 2(2.54,0) 3(5.08,0) 4(7.62,0)
Top Overlay:
  circle w0.3: c-0.508,1.778 r0.15
  lines w0.2: -1.27,-0.737 -1.016,-1.245 1.016,-1.245 1.27,-0.737 1.524,-1.245 3.556,-1.245 3.81,-0.737 4.064,-1.245 6.096,-1.245 6.35,-0.737 6.604,-1.245 8.636,-1.245 8.89,-0.737 8.89,0.737 8.636,1.245 6.604,1.245 6.35,0.737 6.096,1.245 4.064,1.245 3.81,0.737 3.556,1.245 1.524,1.245 1.27,0.737 1.016,1.245 -1.016,1.245 -1.27,0.737 -1.27,-0.737
Mechanical 8:
  lines w0.1: -0.5,0 0,0 ; 0,-0.5 0,0 ; 0,0.5 0,0 ; 0.5,0 0,0 ; 2.04,0 2.54,0 ; 2.54,-0.5 2.54,0 ; 2.54,0.5 2.54,0 ; 3.04,0 2.54,0 ; 4.58,0 5.08,0 ; 5.08,-0.5 5.08,0 ; 5.08,0.5 5.08,0 ; 5.58,0 5.08,0 ; 7.12,0 7.62,0 ; 7.62,-0.5 7.62,0 ; 7.62,0.5 7.62,0 ; 8.12,0 7.62,0
Mechanical 14:
  circle w0.3: c-0.508,1.778 r0.15
  lines w0.1: -1.27,-0.737 -1.016,-1.245 1.016,-1.245 1.27,-0.737 1.524,-1.245 3.556,-1.245 3.81,-0.737 4.064,-1.245 6.096,-1.245 6.35,-0.737 6.604,-1.245 8.636,-1.245 8.89,-0.737 8.89,0.737 8.636,1.245 6.604,1.245 6.35,0.737 6.096,1.245 4.064,1.245 3.81,0.737 3.556,1.245 1.524,1.245 1.27,0.737 1.016,1.245 -1.016,1.245 -1.27,0.737 -1.27,-0.737 ; -0.317,-0.318 0.318,-0.318 0.318,0.318 -0.317,0.318 -0.317,-0.318 ; 2.223,-0.318 2.858,-0.318 2.858,0.318 2.223,0.318 2.223,-0.318 ; 4.763,-0.318 5.398,-0.318 5.398,0.318 4.763,0.318 4.763,-0.318 ; 7.303,-0.318 7.938,-0.318 7.938,0.318 7.303,0.318 7.303,-0.318
3D body: height 7.87, standoff -3.05, extent -1.27,-1.244 8.89,1.245

## SAMTEC_MTLW-105-07-L-D-250 [mm] "10 Contacts - Pitch 2.54mm - Dual Row Through Mount Straight Header (Post Lead = 6.35mm, Tail Lead 3.05mm, Insulator 1.52mm)"
height 7.87
pads (10):
  round 1.7 hole 1: 1(-5.08,-1.27) 2(-5.08,1.27) 3(-2.54,-1.27) 4(-2.54,1.27) 5(0,-1.27) 6(0,1.27) 7(2.54,-1.27) 8(2.54,1.27) 9(5.08,-1.27) 10(5.08,1.27)
Top Overlay:
  circle w0.3: c-5.045,-3.135 r0.15
  lines w0.2: -6.35,-2.007 -6.35,2.007 -6.096,2.515 -4.064,2.515 -3.81,2.007 -3.556,2.515 -1.524,2.515 -1.27,2.007 -1.016,2.515 1.016,2.515 1.27,2.007 1.524,2.515 3.556,2.515 3.81,2.007 4.064,2.515 6.096,2.515 6.35,2.007 6.35,-2.007 6.096,-2.515 4.064,-2.515 3.81,-2.007 3.556,-2.515 1.524,-2.515 1.27,-2.007 1.016,-2.515 -1.016,-2.515 -1.27,-2.007 -1.524,-2.515 -3.556,-2.515 -3.81,-2.007 -4.064,-2.515 -6.096,-2.515 -6.35,-2.007
  text "1" at -7.327,-1.768 h1
Mechanical 8:
  lines w0.1: -5.58,-1.27 -5.08,-1.27 ; -5.58,1.27 -5.08,1.27 ; -5.08,-1.77 -5.08,-1.27 ; -5.08,-0.77 -5.08,-1.27 ; -5.08,0.77 -5.08,1.27 ; -5.08,1.77 -5.08,1.27 ; -4.58,-1.27 -5.08,-1.27 ; -4.58,1.27 -5.08,1.27 ; -3.04,-1.27 -2.54,-1.27 ; -3.04,1.27 -2.54,1.27 ; -2.54,-1.77 -2.54,-1.27 ; -2.54,-0.77 -2.54,-1.27 ; -2.54,0.77 -2.54,1.27 ; -2.54,1.77 -2.54,1.27 ; -2.04,-1.27 -2.54,-1.27 ; -2.04,1.27 -2.54,1.27 ; -0.5,-1.27 0,-1.27 ; -0.5,0 0,0 ; -0.5,1.27 0,1.27 ; 0,-1.77 0,-1.27 ; 0,-0.77 0,-1.27 ; 0,-0.5 0,0 ; 0,0.5 0,0 ; 0,0.77 0,1.27 ; 0,1.77 0,1.27 ; 0.5,-1.27 0,-1.27 ; 0.5,0 0,0 ; 0.5,1.27 0,1.27 ; 2.04,-1.27 2.54,-1.27 ; 2.04,1.27 2.54,1.27 ; 2.54,-1.77 2.54,-1.27 ; 2.54,-0.77 2.54,-1.27 ; 2.54,0.77 2.54,1.27 ; 2.54,1.77 2.54,1.27 ; 3.04,-1.27 2.54,-1.27 ; 3.04,1.27 2.54,1.27 ; 4.58,-1.27 5.08,-1.27 ; 4.58,1.27 5.08,1.27 ; 5.08,-1.77 5.08,-1.27 ; 5.08,-0.77 5.08,-1.27 ; 5.08,0.77 5.08,1.27 ; 5.08,1.77 5.08,1.27 ; 5.58,-1.27 5.08,-1.27 ; 5.58,1.27 5.08,1.27
Mechanical 14:
  circle w0.3: c-5.045,-3.135 r0.15
  lines w0.1: -6.35,-2.007 -6.35,2.007 -6.096,2.515 -4.064,2.515 -3.81,2.007 -3.556,2.515 -1.524,2.515 -1.27,2.007 -1.016,2.515 1.016,2.515 1.27,2.007 1.524,2.515 3.556,2.515 3.81,2.007 4.064,2.515 6.096,2.515 6.35,2.007 6.35,-2.007 6.096,-2.515 4.064,-2.515 3.81,-2.007 3.556,-2.515 1.524,-2.515 1.27,-2.007 1.016,-2.515 -1.016,-2.515 -1.27,-2.007 -1.524,-2.515 -3.556,-2.515 -3.81,-2.007 -4.064,-2.515 -6.096,-2.515 -6.35,-2.007 ; -5.397,-1.587 -5.397,-0.953 -4.762,-0.953 -4.762,-1.587 -5.397,-1.587 ; -5.397,0.953 -5.397,1.587 -4.762,1.587 -4.762,0.953 -5.397,0.953 ; -2.857,-1.587 -2.857,-0.953 -2.222,-0.953 -2.222,-1.587 -2.857,-1.587 ; -2.857,0.953 -2.857,1.587 -2.222,1.587 -2.222,0.953 -2.857,0.953 ; -0.317,-1.587 -0.317,-0.953 0.318,-0.953 0.318,-1.587 -0.317,-1.587 ; -0.317,0.953 -0.317,1.587 0.318,1.587 0.318,0.953 -0.317,0.953 ; 2.223,-1.587 2.223,-0.953 2.858,-0.953 2.858,-1.587 2.223,-1.587 ; 2.223,0.953 2.223,1.587 2.858,1.587 2.858,0.953 2.223,0.953 ; 4.763,-1.587 4.763,-0.953 5.398,-0.953 5.398,-1.587 4.763,-1.587 ; 4.763,0.953 4.763,1.587 5.398,1.587 5.398,0.953 4.763,0.953
  text "1" at -7.327,-1.768 h1
3D body: height 7.87, standoff -3.05, extent -6.35,-2.514 6.35,2.515